# Altium footprint library Regular_Components.PcbLib: 42 footprints (part 1 of 3)
Each footprint in its own frame and in the unit in brackets; x right, y up, seen from the top. Pads: shape width x height; smd on the part's side, far side on the other; paste and mask are expansions set on the pad; w line width, h text height; cw(c..) or ccw(c..) is an arc to the next point about the centre after c.
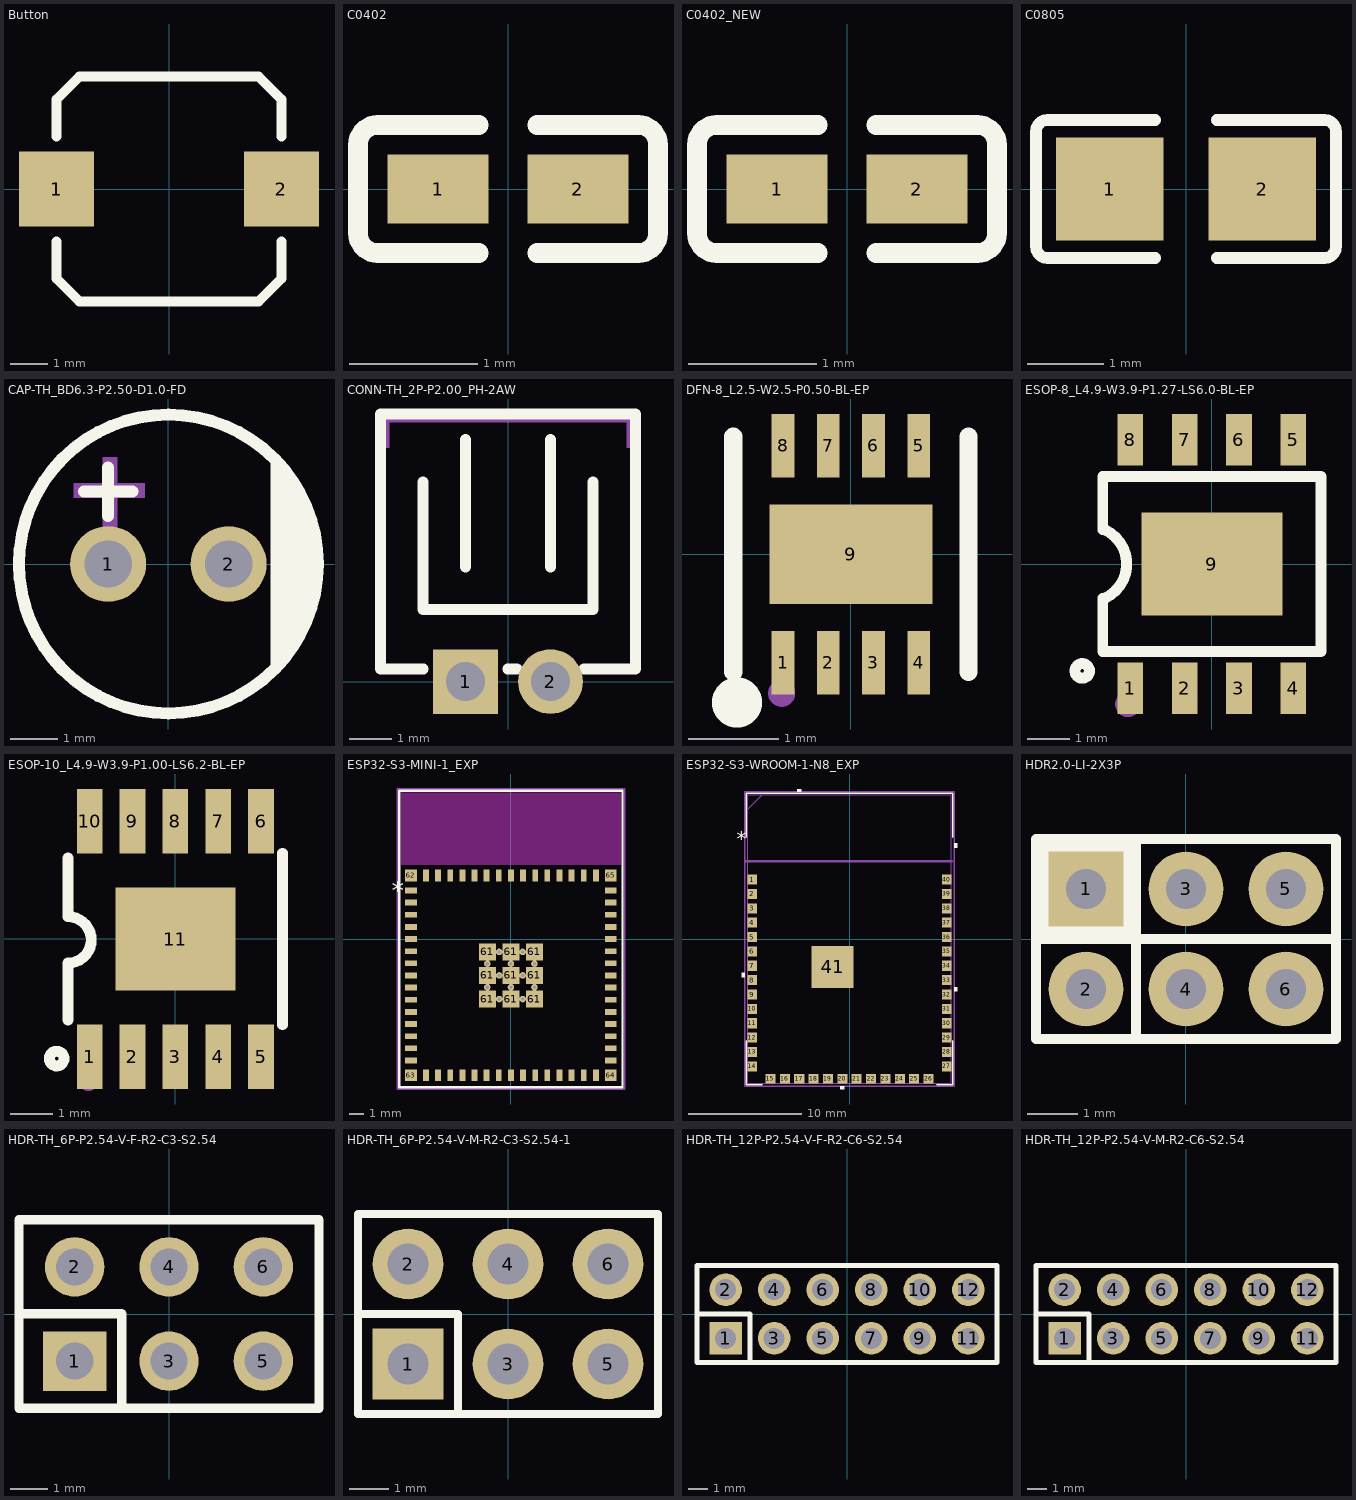
[diagram p0: the footprints below, top view; thin cyan lines are the x and y axes]

## Button [mm]
pads (2):
  rect 2x2 smd: 1(-3,0) 2(3,0)
Top Overlay:
  lines w0.254: -3,-1.4 -3,-2.39 -2.39,-3 2.39,-3 3,-2.39 3,-1.4 ; -3,1.4 -3,2.39 -2.39,3 2.39,3 3,2.39 3,1.4
3D body "Button.STEP": height 2.5, standoff 0, extent -3,-3 3,3

## C0402 [mm]
pads (2):
  rect 0.79x0.54 smd: 1(-0.545,0) 2(0.545,0)
Top Overlay:
  lines w0.152: -0.226,-0.499 -1.016,-0.499 cw(c-1.016,-0.346) -1.169,-0.346 -1.169,0.346 cw(c-1.016,0.346) -1.016,0.499 -0.226,0.499 ; 0.226,-0.499 1.016,-0.499 ccw(c1.016,-0.346) 1.169,-0.346 1.169,0.346 ccw(c1.016,0.346) 1.016,0.499 0.226,0.499
Top Paste:
  region: -0.18,0.225 -0.18,-0.225 -0.25,-0.275 -0.73,-0.275 -0.78,-0.225 -0.78,0.225 -0.73,0.275 -0.25,0.275
  region: 0.78,0.225 0.78,-0.225 0.73,-0.275 0.25,-0.275 0.18,-0.225 0.18,0.225 0.25,0.275 0.73,0.275
3D body "C0402_NEW.STEP": height 0.5, standoff 0, extent -0.5,-0.25 0.5,0.25

## C0402_NEW [mm]
pads (2):
  rect 0.79x0.54 smd: 1(-0.545,0) 2(0.545,0)
Top Overlay:
  lines w0.152: -0.226,-0.499 -1.016,-0.499 cw(c-1.016,-0.346) -1.169,-0.346 -1.169,0.346 cw(c-1.016,0.346) -1.016,0.499 -0.226,0.499 ; 0.226,-0.499 1.016,-0.499 ccw(c1.016,-0.346) 1.169,-0.346 1.169,0.346 ccw(c1.016,0.346) 1.016,0.499 0.226,0.499
Top Paste:
  region: 0.83,0.225 0.83,-0.225 0.78,-0.275 0.25,-0.275 0.2,-0.225 0.2,0.225 0.25,0.275 0.78,0.275
  region: -0.2,0.225 -0.2,-0.225 -0.25,-0.275 -0.78,-0.275 -0.83,-0.225 -0.83,0.225 -0.78,0.275 -0.25,0.275
3D body "C0402_NEW.STEP": height 0.5, standoff 0, extent -0.5,-0.25 0.5,0.25

## C0805 [mm]
pads (2):
  rect 1.41x1.35 smd: 1(-1,0) 2(1,0)
Top Overlay:
  lines w0.152: -0.401,-0.904 -1.811,-0.904 cw(c-1.811,-0.751) -1.964,-0.751 -1.964,0.751 cw(c-1.811,0.751) -1.811,0.904 -0.401,0.904 ; 0.401,-0.904 1.811,-0.904 ccw(c1.811,-0.751) 1.964,-0.751 1.964,0.751 ccw(c1.811,0.751) 1.811,0.904 0.401,0.904
Top Paste:
  region: -1.675,-0.62 -1.675,0.66 -1.625,0.71 -0.475,0.71 -0.425,0.66 -0.42,0.25 -0.87,0.25 -0.87,-0.2 -0.43,-0.2 -0.425,-0.62 -0.475,-0.67 -1.625,-0.67
  region: 0.475,-0.62 0.475,-0.2 0.92,-0.2 0.92,0.25 0.48,0.25 0.475,0.66 0.525,0.71 1.675,0.71 1.725,0.66 1.725,-0.62 1.675,-0.67 0.525,-0.67
3D body "C0805.STEP": height 1.3, standoff 0, extent -1,-0.65 1,0.65

## CAP-TH_BD6.3-P2.50-D1.0-FD [mm]
pads (2):
  round 1.6 hole 1: 1(-1.27,0) 2(1.27,0)
Top Overlay:
  circle w0.254: c0,0 r3.15
  region: 2.159,2.286 2.319,2.142 2.595,1.812 2.822,1.447 2.997,1.054 3.115,0.641 3.175,0.215 3.175,-0.215 3.115,-0.641 2.997,-1.054 2.822,-1.447 2.595,-1.812 2.319,-2.142 2.159,-2.286
  lines w0.254: -1.778,1.524 -0.762,1.524 ; -1.27,1.016 -1.27,2.032
Mechanical 15:
  region: -2,1.7 -0.5,1.7 -0.5,1.4 -2,1.4
  region: -1.381,0.752 -1.381,2.252 -1.081,2.252 -1.081,0.752
3D body "CAP-TH_BD6.3-P2.50-D1.0-FD.STEP": height 11.11, standoff -3.5, extent -3.155,-3.148 3.155,3.151

## CONN-TH_2P-P2.00_PH-2AW [mil]
pads (2):
  rect 60x60 hole 36: 1(-39.37,0)
  round 60 hole 36: 2(39.37,0)
Top Overlay:
  lines w10: -78.77,185.04 -78.77,66.93 78.71,66.93 78.71,185.04 ; -78.5,11.81 -118.14,11.81 -118.14,248.03 118.08,248.03 118.08,11.81 70.53,11.81 ; -39.4,106.3 -39.4,224.41 ; -0.3,11.81 8.27,11.81 ; 39.34,106.3 39.34,224.41
Mechanical 15:
  region: -118.11,216.54 -118.11,248.03 118.11,248.03 118.11,216.54 110.24,216.54 110.24,240.16 -110.24,240.16 -110.24,216.54
3D body "CONN-TH_2P-P2.00_PH-2AW.STEP": height 185.04, standoff -139.76, extent -118.15,-11.81 118.11,248.03

## DFN-8_L2.5-W2.5-P0.50-BL-EP [mm]
pads (9):
  rect 0.25x0.7 smd: 1(-0.75,-1.2) 2(-0.25,-1.2) 3(0.25,-1.2) 4(0.75,-1.2) 5(0.75,1.2) 6(0.25,1.2) 7(-0.25,1.2) 8(-0.75,1.2)
  rect 1.8x1.1 smd: 9(0,0)
Top Overlay:
  lines w0.203: -1.3,-1.3 -1.3,1.3 ; 1.3,-1.3 1.3,1.3
  lines w0.3: -1.26,-1.513 ccw(c-1.259,-1.64) -1.258,-1.513
Mechanical 15:
  circle w0.15: c-0.765,-1.537 r0.075
3D body "DFN-8_L2.5-W2.5-P0.50-BL-EP.STEP": height 1.02, standoff 0, extent -1.25,-1.26 1.25,1.26

## ESOP-8_L4.9-W3.9-P1.27-LS6.0-BL-EP [mm]
pads (9):
  rect 0.6x1.2 smd: 1(-1.905,-2.908) 2(-0.635,-2.908) 3(0.635,-2.908) 4(1.905,-2.908) 5(1.905,2.908) 6(0.635,2.908) 7(-0.635,2.908) 8(-1.905,2.908)
  rect 3.3x2.4 smd: 9(0,0)
Top Overlay:
  circle w0.254: c-3.03,-2.5 r0.17
  lines w0.254: -2.55,-0.8 -2.55,-2.05 2.55,-2.05 2.55,2.05 -2.55,2.05 -2.55,0.8 ; -2.5,-0.8 ccw(c-2.875,0) -2.5,0.8
Mechanical 15:
  circle w0.3: c-1.96,-3.28 r0.15
3D body "ESOP-8_L4.9-W3.9-P1.27-LS6.0-BL-EP.STEP": height 1.7, standoff 0, extent -2.448,-3.05 2.448,3.05

## ESOP-10_L4.9-W3.9-P1.00-LS6.2-BL-EP [mm]
pads (11):
  rect 0.6x1.5 smd: 1(-2,-2.75) 2(-1,-2.75) 3(0,-2.75) 4(1,-2.75) 5(2,-2.75) 6(2,2.75) 7(1,2.75) 8(0,2.75) 9(-1,2.75) 10(-2,2.75)
  rect 2.8x2.4 smd: 11(0,0)
Top Overlay:
  circle w0.254: c-2.77,-2.79 r0.171
  lines w0.254: -2.5,-1.887 -2.5,-0.564 ; -2.501,-0.563 ccw(c-2.504,-0.022) -2.5,0.52 -2.5,1.887 ; 2.5,-2 2.5,2
Mechanical 15:
  circle w0.2: c-2.03,-3.35 r0.1
3D body "ESOP-10_L4.9-W3.9-P1.00-LS6.2-BL-EP.STEP": height 1.45, standoff 0, extent -2.45,-3.075 2.45,3.075

## ESP32-S3-MINI-1_EXP [mil]
pads (85):
  rect 32x16 smd paste+0 mask+0: 1(-275.59,133.75) 2(-275.59,100.29) 3(-275.59,66.82) 4(-275.59,33.36) 5(-275.59,-0.11) 6(-275.59,-33.57) 7(-275.59,-67.04) 8(-275.59,-100.5) 9(-275.59,-133.96) 10(-275.59,-167.43) 11(-275.59,-200.89) 12(-275.59,-234.36) 13(-275.59,-267.82) 14(-275.59,-301.29) 15(-275.59,-334.75) 31(275.59,-334.75) 32(275.59,-301.29) 33(275.59,-267.82) 34(275.59,-234.36) 35(275.59,-200.89) 36(275.59,-167.43) 37(275.59,-133.96) 38(275.59,-100.5) 39(275.59,-67.04) 40(275.59,-33.57) 41(275.59,-0.11) 42(275.59,33.36) 43(275.59,66.82) 44(275.59,100.29) 45(275.59,133.75)
  rect 16x32 smd paste+0 mask+0: 16(-234.25,-376.09) 17(-200.79,-376.09) 18(-167.32,-376.09) 19(-133.86,-376.09) 20(-100.39,-376.09) 21(-66.93,-376.09) 22(-33.46,-376.09) 23(0,-376.09) 24(33.46,-376.09) 25(66.93,-376.09) 26(100.39,-376.09) 27(133.86,-376.09) 28(167.32,-376.09) 29(200.79,-376.09) 30(234.25,-376.09) 46(234.25,175.09) 47(200.79,175.09) 48(167.32,175.09) 49(133.86,175.09) 50(100.39,175.09) 51(66.93,175.09) 52(33.46,175.09) 53(0,175.09) 54(-33.46,175.09) 55(-66.93,175.09) 56(-100.39,175.09) 57(-133.86,175.09) 58(-167.32,175.09) 59(-200.79,175.09) 60(-234.25,175.09)
  rect 47x47 smd paste+0 mask+0: 61(-64.96,-165.46) 61(-64.96,-100.5) 61(-64.96,-35.54) 61(0,-165.46) 61(0,-100.5) 61(0,-35.54) 61(64.96,-165.46) 61(64.96,-100.5) 61(64.96,-35.54)
  round 18 hole 9: 61(-64.96,-132.99) 61(-64.96,-68.03) 61(-32.48,-165.47) 61(-32.48,-100.51) 61(-32.48,-35.55) 61(0,-132.99) 61(0,-68.03) 61(32.48,-165.47) 61(32.48,-100.51) 61(32.48,-35.55) 61(64.96,-132.99) 61(64.96,-68.03)
  rect 32x32 smd: 62(-275.59,175.09) 63(-275.59,-376.09) 64(275.59,-376.09) 65(275.59,175.09)
Top Overlay:
  lines w6: -308,-408.5 -308,408.5 308,408.5 308,-408.5 -308,-408.5
  text "*" at -329.09,108.75 h50
Keep-Out Layer:
  region: 303,403.5 -303,403.5 -303,204.5 303,204.5
Mechanical 15:
  lines w6: -313,-413.5 -313,413.5 313,413.5 313,-413.5 -313,-413.5
3D body "ESP32-S3-MINI-1.STEP": height 94.49, standoff 0, extent -303.15,-402.09 303.15,405

## ESP32-S3-WROOM-1-N8_EXP [mil]
pads (41):
  rect 33x35 smd paste+0 mask+0: 1(-337.83,206.84) 2(-337.83,156.84) 3(-337.83,106.84) 4(-337.83,56.84) 5(-337.83,6.84) 6(-337.83,-43.16) 7(-337.83,-93.16) 8(-337.83,-143.16) 9(-337.83,-193.16) 10(-337.83,-243.16) 11(-337.83,-293.16) 12(-337.83,-343.16) 13(-337.83,-393.16) 14(-337.83,-443.16) 27(337.83,-443.16) 28(337.83,-393.16) 29(337.83,-343.16) 30(337.83,-293.16) 31(337.83,-243.16) 32(337.83,-193.16) 33(337.83,-143.16) 34(337.83,-93.16) 35(337.83,-43.16) 36(337.83,6.84) 37(337.83,56.84) 38(337.83,106.84) 39(337.83,156.84) 40(337.83,206.84)
  rect 35x33 smd paste+0 mask+0: 15(-275,-485.47) 16(-225,-485.47) 17(-175,-485.47) 18(-125,-485.47) 19(-75,-485.47) 20(-25,-485.47) 21(25,-485.47) 22(75,-485.47) 23(125,-485.47) 24(175,-485.47) 25(225,-485.47) 26(275,-485.47)
  rect 146x146 smd paste-72.5 mask+0: 41(-58.89,-96.88)
Top Overlay:
  region: -364.33,-117.5 -374.33,-117.5 -374.33,-132.5 -364.33,-132.5
  region: -17.5,-511.97 -32.5,-511.97 -32.5,-521.97 -17.5,-521.97
  region: 364.33,-167.5 374.33,-167.5 374.33,-182.5 364.33,-182.5
  region: 364.33,332.5 374.33,332.5 374.33,317.5 364.33,317.5
  region: -167.5,511.97 -182.5,511.97 -182.5,521.97 -167.5,521.97
  lines w6: -359.5,-354.54 -359.5,-507 -304.6,-507 ; -359.5,354.54 -359.5,507 359.5,507 359.5,354.54 ; 304.6,-507 359.5,-507 359.5,-354.54
  text "*" at -391.83,325 h50
Mechanical 5:
  lines w10: -359.5,270.5 355.5,270.5
Mechanical 13:
  drawing of 162 lines, arcs and shapes, not listed
  text "*" at -333.83,325 h50
Mechanical 15:
  lines w6: -364.5,-512 -364.5,-352.5 -364.5,352.5 -364.5,512 -302.5,512 302.5,512 364.5,512 364.5,352.5 364.5,-352.5 364.5,-512 302.5,-512 -302.5,-512 -364.5,-512
3D body "ESP32-S3-WROOM-1_20211021.STEP": height 122.05, standoff 0, extent -354.33,-505 354.33,498.94
3D body: height 10, standoff 0, extent 0,0 10,10

## HDR2.0-LI-2X3P [mm] "直插，脚距：2.0mm"
pads (6):
  rect 1.5x1.5 hole 0.8: 1(-2,1)
  round 1.5 hole 0.8: 2(-2,-1) 3(0,1) 4(0,-1) 5(2,1) 6(2,-1)
Top Overlay:
  rectangle: -3,0 -1,2
  lines w0.2: -1,-2 -1,0 -1,2 ; -3,0 -3,-2 3,-2 3,0 ; -3,0 3,0 ; -3,0 -3,2 3,2 3,0 ; -3,0 3,0
3D body "HDR2.0-LI-2x3P.STEP": height 6.5, standoff -2.8, extent -3,-2 3,2

## HDR-TH_6P-P2.54-V-F-R2-C3-S2.54 [mm]
pads (6):
  rect 1.7x1.6 hole 1: 1(-2.54,-1.27)
  round 1.6 hole 1: 2(-2.54,1.27) 3(0,-1.27) 4(0,1.27) 5(2.54,-1.27) 6(2.54,1.27)
Top Overlay:
  lines w0.254: -4.04,0.007 -1.27,0.007 -1.27,-2.54 ; -4.04,-2.54 4.04,-2.54 4.04,2.54 -4.04,2.54 -4.04,-2.54
3D body "HDR-TH_6P-P2.54-V-F-R2-C3-S2.54.STEP": height 8.5, standoff -3.2, extent -4.01,-2.5 4.02,2.5

## HDR-TH_6P-P2.54-V-M-R2-C3-S2.54-1 [mm]
pads (6):
  rect 1.8x1.8 hole 1.05: 1(-2.54,-1.27)
  round 1.8 hole 1.05: 2(-2.54,1.27) 3(0,-1.27) 4(0,1.27) 5(2.54,-1.27) 6(2.54,1.27)
Top Overlay:
  lines w0.203: -3.81,0.002 -1.27,0.002 -1.27,-2.54 ; -1.058,-2.54 3.81,-2.54 ; 3.81,-2.54 -3.81,-2.54 -3.81,2.54 3.81,2.54 3.81,-2.54
3D body "HDR2.54-1x2P.STEP": height 8.5, standoff -3, extent -3.81,-2.54 -1.27,2.54
3D body "HDR2.54-1x2P.STEP": height 8.5, standoff -3, extent -1.27,-2.54 1.27,2.54
3D body "HDR2.54-1x2P.STEP": height 8.5, standoff -3, extent 1.27,-2.54 3.81,2.54

## HDR-TH_12P-P2.54-V-F-R2-C6-S2.54 [mm]
pads (12):
  rect 1.7x1.7 hole 1.1: 1(-6.35,-1.27)
  round 1.7 hole 1.1: 2(-6.35,1.27) 3(-3.81,-1.27) 4(-3.81,1.27) 5(-1.27,-1.27) 6(-1.27,1.27) 7(1.27,-1.27) 8(1.27,1.27) 9(3.81,-1.27) 10(3.81,1.27) 11(6.35,-1.27) 12(6.35,1.27)
Top Overlay:
  lines w0.254: -7.85,0.007 -5.08,0.007 -5.08,-2.54 ; -7.85,-2.54 7.85,-2.54 7.85,2.54 -7.85,2.54 -7.85,-2.54
3D body "HDR-TH_12P-P2.54-V-F-R2-C6-S2.54.STEP": height 8.4, standoff -3.3, extent -7.82,-2.5 7.83,2.5

## HDR-TH_12P-P2.54-V-M-R2-C6-S2.54 [mm]
pads (12):
  rect 1.7x1.7 hole 1.1: 1(-6.35,-1.27)
  round 1.7 hole 1.1: 2(-6.35,1.27) 3(-3.81,-1.27) 4(-3.81,1.27) 5(-1.27,-1.27) 6(-1.27,1.27) 7(1.27,-1.27) 8(1.27,1.27) 9(3.81,-1.27) 10(3.81,1.27) 11(6.35,-1.27) 12(6.35,1.27)
Top Overlay:
  lines w0.254: -7.85,0.007 -5.08,0.007 -5.08,-2.54 ; -7.85,-2.54 7.85,-2.54 7.85,2.54 -7.85,2.54 -7.85,-2.54
3D body "HDR2.54-1x2P.STEP": height 8.5, standoff -3, extent 5.08,-2.54 7.62,2.54
3D body "HDR2.54-1x2P.STEP": height 8.5, standoff -3, extent 2.54,-2.54 5.08,2.54
3D body "HDR2.54-1x2P.STEP": height 8.5, standoff -3, extent 0,-2.54 2.54,2.54
3D body "HDR2.54-1x2P.STEP": height 8.5, standoff -3, extent -2.54,-2.54 0,2.54
3D body "HDR2.54-1x2P.STEP": height 8.5, standoff -3, extent -5.08,-2.54 -2.54,2.54
3D body "HDR2.54-1x2P.STEP": height 8.5, standoff -3, extent -7.62,-2.54 -5.08,2.54